# Altium footprint library LukaLIBRARY.PcbLib: 784 footprints (part 38 of 49)
Each footprint in its own frame and in the unit in brackets; x right, y up, seen from the top. Pads: shape width x height; smd on the part's side, far side on the other; paste and mask are expansions set on the pad; w line width, h text height; cw(c..) or ccw(c..) is an arc to the next point about the centre after c.
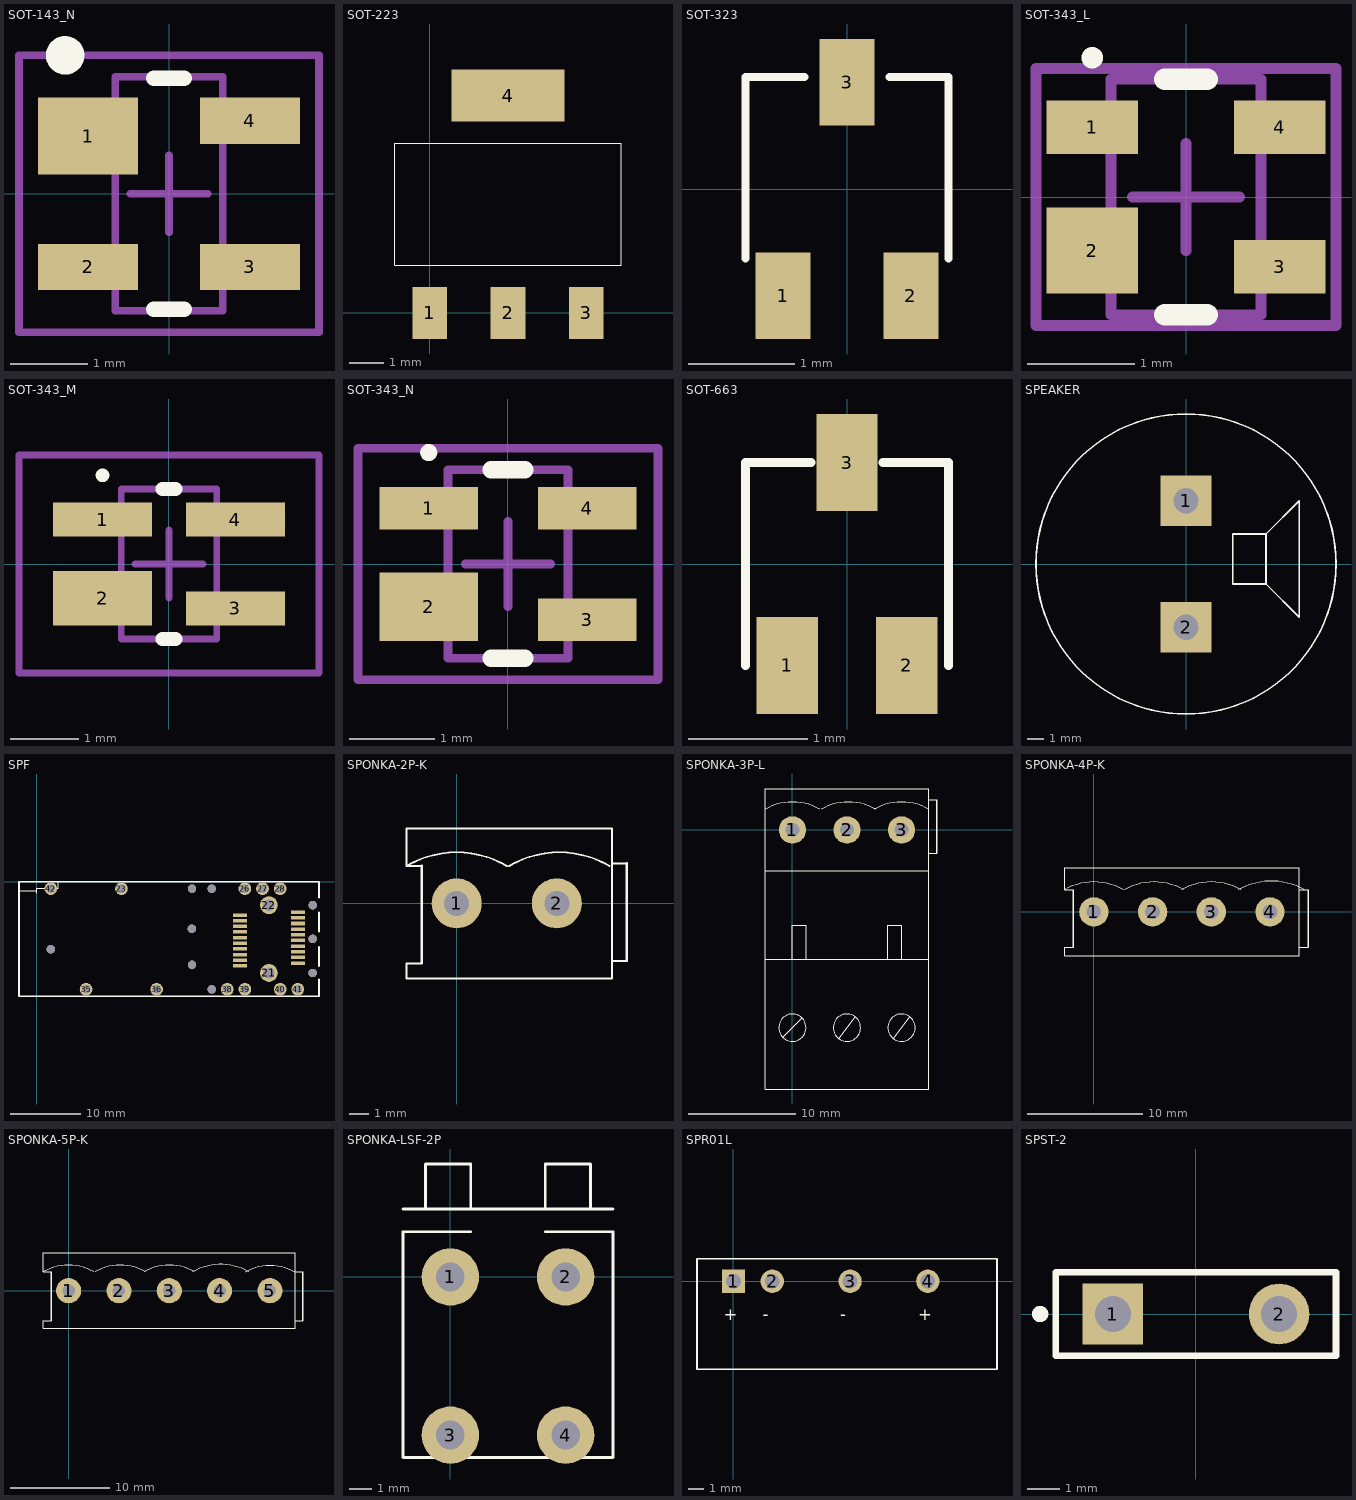
[diagram p37: the footprints below, top view; thin cyan lines are the x and y axes]

## SOT-143_N [mm] "SOT143, 4-Leads, Body 2.9x1.3mm, Pitch 1.9mm, Lead Span 2.5mm, IPC Medium Density"
height 1.1
pads (4):
  rect 1.3x1 smd: 1(-1.05,0.75)
  rect 1.3x0.6 smd: 2(-1.05,-0.95) 3(1.05,-0.95) 4(1.05,0.95)
Top Overlay:
  circle w0.25: c-1.35,1.8 r0.125
  lines w0.2: -0.2,-1.5 0.2,-1.5 ; -0.2,1.5 0.2,1.5
Mechanical 13:
  lines w0.1: -0.7,-1.52 -0.7,1.52 0.7,1.52 0.7,-1.52 -0.7,-1.52
Mechanical 15:
  lines w0.1: -0.5,0 0.5,0 ; 0,-0.5 0,0.5 ; -1.95,-1.8 -1.95,1.8 1.95,1.8 1.95,-1.8 -1.95,-1.8
3D body: height 1.1, standoff 0, extent -0.7,-1.52 0.7,1.52

## SOT-223 [mil]
pads (4):
  rect 40x60 smd mask-1000: 1(0,0) 2(90,0) 3(180,0)
  rect 130x60 smd mask-1000: 4(90,250)
Top Overlay:
  lines w1: -40,55 220,55 220,195 -40,195 -40,55
Top Solder:
  region: 25,220 155,220 155,280 25,280
  region: 160,-30 200,-30 200,30 160,30
  region: 70,-30 110,-30 110,30 70,30
  region: -20,-30 20,-30 20,30 -20,30

## SOT-323 [mm]
pads (3):
  rect 0.513x0.813 smd: 1(-0.6,-1) 2(0.6,-1) 3(0,1)
Top Overlay:
  lines w0.076: -0.95,-0.65 -0.95,1.05 -0.4,1.05 ; 0.4,1.05 0.95,1.05 0.95,-0.65

## SOT-343_L [mm] "SOT343, 4-Leads, Body 2x1.3 mm, Pitch 1.3mm, Lead Span 2.1mm, IPC High Density"
height 1
pads (4):
  rect 0.85x0.5 smd: 1(-0.875,0.65) 3(0.875,-0.65) 4(0.875,0.65)
  rect 0.85x0.8 smd: 2(-0.875,-0.5)
Top Overlay:
  circle w0.1: c-0.875,1.3 r0.05
  lines w0.2: -0.2,-1.1 0.2,-1.1 ; -0.2,1.1 0.2,1.1
Mechanical 13:
  lines w0.1: -0.7,-1.1 -0.7,1.1 0.7,1.1 0.7,-1.1 -0.7,-1.1
Mechanical 15:
  lines w0.1: -0.5,0 0.5,0 ; 0,-0.5 0,0.5 ; -1.4,-1.2 -1.4,1.2 1.4,1.2 1.4,-1.2 -1.4,-1.2
3D body: height 1, standoff 0, extent -0.7,-1.1 0.7,1.1

## SOT-343_M [mm] "SOT343, 4-Leads, Body 2x1.3 mm, Pitch 1.3mm, Lead Span 2.1mm, IPC Low Density"
height 1
pads (4):
  rect 1.45x0.5 smd: 1(-0.975,0.65) 3(0.975,-0.65) 4(0.975,0.65)
  rect 1.45x0.8 smd: 2(-0.975,-0.5)
Top Overlay:
  circle w0.1: c-0.975,1.3 r0.05
  lines w0.2: -0.1,-1.1 0.1,-1.1 ; -0.1,1.1 0.1,1.1
Mechanical 13:
  lines w0.1: -0.7,-1.1 0.7,-1.1 0.7,1.1 -0.7,1.1 -0.7,-1.1
Mechanical 15:
  lines w0.1: -0.5,0 0.5,0 ; 0,-0.5 0,0.5 ; -2.2,-1.6 2.2,-1.6 2.2,1.6 -2.2,1.6 -2.2,-1.6
3D body: height 1, standoff 0, extent -0.7,-1.1 0.7,1.1

## SOT-343_N [mm] "SOT343, 4-Leads, Body 2x1.3 mm, Pitch 1.3mm, Lead Span 2.1mm, IPC Medium Density"
height 1
pads (4):
  rect 1.15x0.5 smd: 1(-0.925,0.65) 3(0.925,-0.65) 4(0.925,0.65)
  rect 1.15x0.8 smd: 2(-0.925,-0.5)
Top Overlay:
  circle w0.1: c-0.925,1.3 r0.05
  lines w0.2: -0.2,-1.1 0.2,-1.1 ; -0.2,1.1 0.2,1.1
Mechanical 13:
  lines w0.1: -0.7,-1.1 0.7,-1.1 0.7,1.1 -0.7,1.1 -0.7,-1.1
Mechanical 15:
  lines w0.1: -0.5,0 0.5,0 ; 0,-0.5 0,0.5 ; -1.75,-1.35 1.75,-1.35 1.75,1.35 -1.75,1.35 -1.75,-1.35
3D body: height 1, standoff 0, extent -0.7,-1.1 0.7,1.1

## SOT-663 [mm]
pads (3):
  rect 0.513x0.813 smd: 1(-0.5,-0.85) 2(0.5,-0.85) 3(0,0.85)
Top Overlay:
  lines w0.076: -0.85,-0.85 -0.85,0.85 -0.3,0.85 ; 0.3,0.85 0.85,0.85 0.85,-0.85

## SPEAKER [mil]
pads (2):
  rect 120x120 hole 60 mask-1000: 1(0,149.61) 2(0,-149.61)
Top Overlay:
  circle w3.94: c0,0 r354.33
  lines w3.94: 188.98,-47.24 110.24,-47.24 110.24,70.87 188.98,70.87 ; 188.98,-47.24 188.98,70.87 ; 188.98,-47.24 267.72,-125.98 267.72,149.61 188.98,70.87
Top Solder:
  region: -60,-209.61 60,-209.61 60,-89.61 -60,-89.61
  region: -60,89.61 60,89.61 60,209.61 -60,209.61
Bottom Solder:
  region: -60,-209.61 60,-209.61 60,-89.61 -60,-89.61
  region: -60,89.61 60,89.61 60,209.61 -60,209.61

## SPF [mm]
pads (42):
  rect 2x0.5 smd mask-25.4: 1(28.78,-4.72) 2(28.78,-5.52) 3(28.78,-6.32) 4(28.78,-7.12) 5(28.78,-7.92) 6(28.78,-8.72) 7(28.78,-9.52) 8(28.78,-10.32) 9(28.78,-11.12) 10(28.78,-11.92) 11(36.98,-11.52) 12(36.98,-10.72) 13(36.98,-9.92) 14(36.98,-9.12) 15(36.98,-8.32) 16(36.98,-7.52) 17(36.98,-6.72) 18(36.98,-5.92) 19(36.98,-5.12) 20(36.98,-4.32)
  round 2.524 hole 1.6: 21(32.88,-12.92) 22(32.88,-3.32)
  round 1.8 hole 1.2 mask-25.4: 23(11.99,-0.99) 26(29.48,-0.99) 27(31.98,-0.99) 28(34.48,-0.99) 35(6.98,-15.24) 36(16.98,-15.24) 38(26.98,-15.24) 39(29.48,-15.24) 40(34.48,-15.24) 41(36.98,-15.24) 42(1.99,-0.98)
  round 1.2 hole 1.2 mask-25.4: 24(21.99,-0.99) 25(24.78,-0.99) 29(39.09,-3.32) 30(39.08,-8.1) 31(39.08,-12.93) 32(21.98,-6.66) 33(1.99,-9.56) 34(21.99,-11.79) 37(24.78,-15.25)
Top Layer:
  lines w0.01: 39.08,-12.93 39.08,-12.9
Top Overlay:
  lines w0.01: -2.49,-1.29 0.01,-1.29 ; 0.01,-1.61 0.01,-0.89 3.01,-0.89 3.01,-0.01
  lines w0.254: 39.97,-11.98 39.97,-9.22 39.97,-9.2 ; 39.97,-2.24 39.97,0.01 -2.52,0.01 -2.52,-16.24 39.98,-16.24 39.98,-13.85 ; 39.98,-7.04 39.98,-4.35
Top Solder:
  drawing of 40 lines, arcs and shapes, not listed
Bottom Solder:
  drawing of 20 lines, arcs and shapes, not listed

## SPONKA-2P-K [mm]
pads (2):
  round 2.54 hole 1.27 mask-25.4: 1(0,0) 2(5.08,0)
Top Overlay:
  lines w0.1: -2.543,1.903 cw(c0,-2.413) 2.543,1.903 ; -1.778,-3.048 -2.54,-3.048 -2.54,-3.81 7.874,-3.81 7.874,3.81 -2.54,3.81 -2.54,1.905 -1.778,1.905 ; 2.664,1.903 cw(c5.207,-2.413) 7.75,1.903 ; 7.874,-2.921 8.636,-2.921 ; 7.874,2.032 8.636,2.032
  lines w0.127: -1.778,-3.048 -1.778,1.905 ; 8.636,-2.921 8.636,2.032
Top Solder:
  region: 5.08,1.281 4.748,1.237 4.44,1.109 4.174,0.906 3.971,0.64 3.843,0.332 3.799,0 3.843,-0.332 3.971,-0.64 4.174,-0.906 4.44,-1.109 4.748,-1.237 5.08,-1.281 5.412,-1.237 5.72,-1.109 5.986,-0.906 6.189,-0.64 6.317,-0.332 6.361,0 6.317,0.332 6.189,0.64 5.986,0.906 5.72,1.109 5.412,1.237
  region: 0,1.281 -0.332,1.237 -0.64,1.109 -0.906,0.906 -1.109,0.64 -1.237,0.332 -1.281,0 -1.237,-0.332 -1.109,-0.64 -0.906,-0.906 -0.64,-1.109 -0.332,-1.237 0,-1.281 0.332,-1.237 0.64,-1.109 0.906,-0.906 1.109,-0.64 1.237,-0.332 1.281,0 1.237,0.332 1.109,0.64 0.906,0.906 0.64,1.109 0.332,1.237
Bottom Solder:
  region: 5.08,1.281 4.748,1.237 4.44,1.109 4.174,0.906 3.971,0.64 3.843,0.332 3.799,0 3.843,-0.332 3.971,-0.64 4.174,-0.906 4.44,-1.109 4.748,-1.237 5.08,-1.281 5.412,-1.237 5.72,-1.109 5.986,-0.906 6.189,-0.64 6.317,-0.332 6.361,0 6.317,0.332 6.189,0.64 5.986,0.906 5.72,1.109 5.412,1.237
  region: 0,1.281 -0.332,1.237 -0.64,1.109 -0.906,0.906 -1.109,0.64 -1.237,0.332 -1.281,0 -1.237,-0.332 -1.109,-0.64 -0.906,-0.906 -0.64,-1.109 -0.332,-1.237 0,-1.281 0.332,-1.237 0.64,-1.109 0.906,-0.906 1.109,-0.64 1.237,-0.332 1.281,0 1.237,0.332 1.109,0.64 0.906,0.906 0.64,1.109 0.332,1.237

## SPONKA-3P-L [mm]
pads (3):
  round 2.54 hole 1.27 mask-25.4: 1(0,0) 2(5.08,0) 3(10.16,0)
Top Overlay:
  circle w0.1: c5.08,-18.415 r1.27
  circle w0.1: c10.16,-18.415 r1.27
  circle w0.1: c0,-18.415 r1.27
  lines w0.1: -2.543,1.903 cw(c0,-2.413) 2.543,1.903 ; -2.54,-12.065 12.7,-12.065 ; -2.54,-3.81 12.7,-3.81 ; -0.889,-19.304 0.889,-17.526 ; 0,-12.065 0,-8.89 1.27,-8.89 1.27,-12.065 ; 2.664,1.903 cw(c5.207,-2.413) 7.75,1.903 ; 4.318,-19.431 5.842,-17.399 ; 7.617,1.903 cw(c10.16,-2.413) 12.703,1.903 ; 8.89,-12.065 8.89,-8.89 10.16,-8.89 10.16,-12.065 ; 9.398,-19.431 10.922,-17.399 ; 12.7,-2.159 13.462,-2.159 ; 12.7,2.794 13.462,2.794 ; -2.54,-24.13 12.7,-24.13 12.7,3.81 -2.54,3.81 -2.54,-24.13
  lines w0.127: 13.462,-2.159 13.462,2.794
Top Solder:
  region: 5.08,1.281 4.748,1.237 4.44,1.109 4.174,0.906 3.971,0.64 3.843,0.332 3.799,0 3.843,-0.332 3.971,-0.64 4.174,-0.906 4.44,-1.109 4.748,-1.237 5.08,-1.281 5.412,-1.237 5.72,-1.109 5.986,-0.906 6.189,-0.64 6.317,-0.332 6.361,0 6.317,0.332 6.189,0.64 5.986,0.906 5.72,1.109 5.412,1.237
  region: 10.16,1.281 9.828,1.237 9.52,1.109 9.254,0.906 9.051,0.64 8.923,0.332 8.879,0 8.923,-0.332 9.051,-0.64 9.254,-0.906 9.52,-1.109 9.828,-1.237 10.16,-1.281 10.492,-1.237 10.8,-1.109 11.066,-0.906 11.269,-0.64 11.397,-0.332 11.441,0 11.397,0.332 11.269,0.64 11.066,0.906 10.8,1.109 10.492,1.237
  region: 0,1.281 -0.332,1.237 -0.64,1.109 -0.906,0.906 -1.109,0.64 -1.237,0.332 -1.281,0 -1.237,-0.332 -1.109,-0.64 -0.906,-0.906 -0.64,-1.109 -0.332,-1.237 0,-1.281 0.332,-1.237 0.64,-1.109 0.906,-0.906 1.109,-0.64 1.237,-0.332 1.281,0 1.237,0.332 1.109,0.64 0.906,0.906 0.64,1.109 0.332,1.237
Bottom Solder:
  region: 5.08,1.281 4.748,1.237 4.44,1.109 4.174,0.906 3.971,0.64 3.843,0.332 3.799,0 3.843,-0.332 3.971,-0.64 4.174,-0.906 4.44,-1.109 4.748,-1.237 5.08,-1.281 5.412,-1.237 5.72,-1.109 5.986,-0.906 6.189,-0.64 6.317,-0.332 6.361,0 6.317,0.332 6.189,0.64 5.986,0.906 5.72,1.109 5.412,1.237
  region: 10.16,1.281 9.828,1.237 9.52,1.109 9.254,0.906 9.051,0.64 8.923,0.332 8.879,0 8.923,-0.332 9.051,-0.64 9.254,-0.906 9.52,-1.109 9.828,-1.237 10.16,-1.281 10.492,-1.237 10.8,-1.109 11.066,-0.906 11.269,-0.64 11.397,-0.332 11.441,0 11.397,0.332 11.269,0.64 11.066,0.906 10.8,1.109 10.492,1.237
  region: 0,1.281 -0.332,1.237 -0.64,1.109 -0.906,0.906 -1.109,0.64 -1.237,0.332 -1.281,0 -1.237,-0.332 -1.109,-0.64 -0.906,-0.906 -0.64,-1.109 -0.332,-1.237 0,-1.281 0.332,-1.237 0.64,-1.109 0.906,-0.906 1.109,-0.64 1.237,-0.332 1.281,0 1.237,0.332 1.109,0.64 0.906,0.906 0.64,1.109 0.332,1.237

## SPONKA-4P-K [mm]
pads (4):
  round 2.54 hole 1.27 mask-25.4: 1(0,0) 2(5.08,0) 3(10.16,0) 4(15.24,0)
Top Overlay:
  lines w0.1: -2.543,1.903 cw(c0,-2.413) 2.543,1.903 ; -1.778,-3.048 -2.54,-3.048 -2.54,-3.81 17.78,-3.81 17.78,3.81 -2.54,3.81 -2.54,1.905 -1.778,1.905 ; 2.664,1.903 cw(c5.207,-2.413) 7.75,1.903 ; 7.617,1.903 cw(c10.16,-2.413) 12.703,1.903 ; 12.531,1.894 cw(c15.367,-2.921) 18.203,1.894 ; 17.78,-3.048 18.542,-3.048 ; 17.78,1.905 18.542,1.905
  lines w0.127: -1.778,-3.048 -1.778,1.905 ; 18.542,-3.048 18.542,1.905
Top Solder:
  region: 0,1.281 -0.332,1.237 -0.64,1.109 -0.906,0.906 -1.109,0.64 -1.237,0.332 -1.281,0 -1.237,-0.332 -1.109,-0.64 -0.906,-0.906 -0.64,-1.109 -0.332,-1.237 0,-1.281 0.332,-1.237 0.64,-1.109 0.906,-0.906 1.109,-0.64 1.237,-0.332 1.281,0 1.237,0.332 1.109,0.64 0.906,0.906 0.64,1.109 0.332,1.237
  region: 5.08,1.281 4.748,1.237 4.44,1.109 4.174,0.906 3.971,0.64 3.843,0.332 3.799,0 3.843,-0.332 3.971,-0.64 4.174,-0.906 4.44,-1.109 4.748,-1.237 5.08,-1.281 5.412,-1.237 5.72,-1.109 5.986,-0.906 6.189,-0.64 6.317,-0.332 6.361,0 6.317,0.332 6.189,0.64 5.986,0.906 5.72,1.109 5.412,1.237
  region: 15.24,1.281 14.908,1.237 14.6,1.109 14.334,0.906 14.131,0.64 14.003,0.332 13.959,0 14.003,-0.332 14.131,-0.64 14.334,-0.906 14.6,-1.109 14.908,-1.237 15.24,-1.281 15.572,-1.237 15.88,-1.109 16.146,-0.906 16.349,-0.64 16.477,-0.332 16.521,0 16.477,0.332 16.349,0.64 16.146,0.906 15.88,1.109 15.572,1.237
  region: 10.16,1.281 9.828,1.237 9.52,1.109 9.254,0.906 9.051,0.64 8.923,0.332 8.879,0 8.923,-0.332 9.051,-0.64 9.254,-0.906 9.52,-1.109 9.828,-1.237 10.16,-1.281 10.492,-1.237 10.8,-1.109 11.066,-0.906 11.269,-0.64 11.397,-0.332 11.441,0 11.397,0.332 11.269,0.64 11.066,0.906 10.8,1.109 10.492,1.237
Bottom Solder:
  region: 0,1.281 -0.332,1.237 -0.64,1.109 -0.906,0.906 -1.109,0.64 -1.237,0.332 -1.281,0 -1.237,-0.332 -1.109,-0.64 -0.906,-0.906 -0.64,-1.109 -0.332,-1.237 0,-1.281 0.332,-1.237 0.64,-1.109 0.906,-0.906 1.109,-0.64 1.237,-0.332 1.281,0 1.237,0.332 1.109,0.64 0.906,0.906 0.64,1.109 0.332,1.237
  region: 5.08,1.281 4.748,1.237 4.44,1.109 4.174,0.906 3.971,0.64 3.843,0.332 3.799,0 3.843,-0.332 3.971,-0.64 4.174,-0.906 4.44,-1.109 4.748,-1.237 5.08,-1.281 5.412,-1.237 5.72,-1.109 5.986,-0.906 6.189,-0.64 6.317,-0.332 6.361,0 6.317,0.332 6.189,0.64 5.986,0.906 5.72,1.109 5.412,1.237
  region: 15.24,1.281 14.908,1.237 14.6,1.109 14.334,0.906 14.131,0.64 14.003,0.332 13.959,0 14.003,-0.332 14.131,-0.64 14.334,-0.906 14.6,-1.109 14.908,-1.237 15.24,-1.281 15.572,-1.237 15.88,-1.109 16.146,-0.906 16.349,-0.64 16.477,-0.332 16.521,0 16.477,0.332 16.349,0.64 16.146,0.906 15.88,1.109 15.572,1.237
  region: 10.16,1.281 9.828,1.237 9.52,1.109 9.254,0.906 9.051,0.64 8.923,0.332 8.879,0 8.923,-0.332 9.051,-0.64 9.254,-0.906 9.52,-1.109 9.828,-1.237 10.16,-1.281 10.492,-1.237 10.8,-1.109 11.066,-0.906 11.269,-0.64 11.397,-0.332 11.441,0 11.397,0.332 11.269,0.64 11.066,0.906 10.8,1.109 10.492,1.237

## SPONKA-5P-K [mm]
pads (5):
  round 2.54 hole 1.27 mask-25.4: 1(0,0) 2(5.08,0) 3(10.16,0) 4(15.24,0) 5(20.32,0)
Top Overlay:
  lines w0.1: -2.543,1.903 cw(c0,-2.413) 2.543,1.903 ; -1.778,-3.048 -2.54,-3.048 -2.54,-3.81 22.86,-3.81 22.86,3.81 -2.54,3.81 -2.54,1.905 -1.778,1.905 ; 2.664,1.903 cw(c5.207,-2.413) 7.75,1.903 ; 7.617,1.903 cw(c10.16,-2.413) 12.703,1.903 ; 12.531,1.894 cw(c15.367,-2.921) 18.203,1.894 ; 17.806,1.855 cw(c20.32,-2.413) 22.834,1.855 ; 22.86,-3.048 23.622,-3.048 ; 22.86,1.905 23.622,1.905
  lines w0.127: -1.778,-3.048 -1.778,1.905 ; 23.622,-3.048 23.622,1.905
Top Solder:
  region: 0,1.281 -0.332,1.237 -0.64,1.109 -0.906,0.906 -1.109,0.64 -1.237,0.332 -1.281,0 -1.237,-0.332 -1.109,-0.64 -0.906,-0.906 -0.64,-1.109 -0.332,-1.237 0,-1.281 0.332,-1.237 0.64,-1.109 0.906,-0.906 1.109,-0.64 1.237,-0.332 1.281,0 1.237,0.332 1.109,0.64 0.906,0.906 0.64,1.109 0.332,1.237
  region: 10.16,1.281 9.828,1.237 9.52,1.109 9.254,0.906 9.051,0.64 8.923,0.332 8.879,0 8.923,-0.332 9.051,-0.64 9.254,-0.906 9.52,-1.109 9.828,-1.237 10.16,-1.281 10.492,-1.237 10.8,-1.109 11.066,-0.906 11.269,-0.64 11.397,-0.332 11.441,0 11.397,0.332 11.269,0.64 11.066,0.906 10.8,1.109 10.492,1.237
  region: 15.24,1.281 14.908,1.237 14.6,1.109 14.334,0.906 14.131,0.64 14.003,0.332 13.959,0 14.003,-0.332 14.131,-0.64 14.334,-0.906 14.6,-1.109 14.908,-1.237 15.24,-1.281 15.572,-1.237 15.88,-1.109 16.146,-0.906 16.349,-0.64 16.477,-0.332 16.521,0 16.477,0.332 16.349,0.64 16.146,0.906 15.88,1.109 15.572,1.237
  region: 5.08,1.281 4.748,1.237 4.44,1.109 4.174,0.906 3.971,0.64 3.843,0.332 3.799,0 3.843,-0.332 3.971,-0.64 4.174,-0.906 4.44,-1.109 4.748,-1.237 5.08,-1.281 5.412,-1.237 5.72,-1.109 5.986,-0.906 6.189,-0.64 6.317,-0.332 6.361,0 6.317,0.332 6.189,0.64 5.986,0.906 5.72,1.109 5.412,1.237
  region: 20.32,1.281 19.988,1.237 19.68,1.109 19.414,0.906 19.211,0.64 19.083,0.332 19.039,0 19.083,-0.332 19.211,-0.64 19.414,-0.906 19.68,-1.109 19.988,-1.237 20.32,-1.281 20.652,-1.237 20.96,-1.109 21.226,-0.906 21.429,-0.64 21.557,-0.332 21.601,0 21.557,0.332 21.429,0.64 21.226,0.906 20.96,1.109 20.652,1.237
Bottom Solder:
  region: 0,1.281 -0.332,1.237 -0.64,1.109 -0.906,0.906 -1.109,0.64 -1.237,0.332 -1.281,0 -1.237,-0.332 -1.109,-0.64 -0.906,-0.906 -0.64,-1.109 -0.332,-1.237 0,-1.281 0.332,-1.237 0.64,-1.109 0.906,-0.906 1.109,-0.64 1.237,-0.332 1.281,0 1.237,0.332 1.109,0.64 0.906,0.906 0.64,1.109 0.332,1.237
  region: 10.16,1.281 9.828,1.237 9.52,1.109 9.254,0.906 9.051,0.64 8.923,0.332 8.879,0 8.923,-0.332 9.051,-0.64 9.254,-0.906 9.52,-1.109 9.828,-1.237 10.16,-1.281 10.492,-1.237 10.8,-1.109 11.066,-0.906 11.269,-0.64 11.397,-0.332 11.441,0 11.397,0.332 11.269,0.64 11.066,0.906 10.8,1.109 10.492,1.237
  region: 15.24,1.281 14.908,1.237 14.6,1.109 14.334,0.906 14.131,0.64 14.003,0.332 13.959,0 14.003,-0.332 14.131,-0.64 14.334,-0.906 14.6,-1.109 14.908,-1.237 15.24,-1.281 15.572,-1.237 15.88,-1.109 16.146,-0.906 16.349,-0.64 16.477,-0.332 16.521,0 16.477,0.332 16.349,0.64 16.146,0.906 15.88,1.109 15.572,1.237
  region: 5.08,1.281 4.748,1.237 4.44,1.109 4.174,0.906 3.971,0.64 3.843,0.332 3.799,0 3.843,-0.332 3.971,-0.64 4.174,-0.906 4.44,-1.109 4.748,-1.237 5.08,-1.281 5.412,-1.237 5.72,-1.109 5.986,-0.906 6.189,-0.64 6.317,-0.332 6.361,0 6.317,0.332 6.189,0.64 5.986,0.906 5.72,1.109 5.412,1.237
  region: 20.32,1.281 19.988,1.237 19.68,1.109 19.414,0.906 19.211,0.64 19.083,0.332 19.039,0 19.083,-0.332 19.211,-0.64 19.414,-0.906 19.68,-1.109 19.988,-1.237 20.32,-1.281 20.652,-1.237 20.96,-1.109 21.226,-0.906 21.429,-0.64 21.557,-0.332 21.601,0 21.557,0.332 21.429,0.64 21.226,0.906 20.96,1.109 20.652,1.237

## SPONKA-LSF-2P [mm]
pads (4):
  round 2.54 hole 1.27 mask-25.4: 1(0,0) 2(5.1,0) 3(0,-7) 4(5.1,-7)
Top Overlay:
  lines w0.127: -2.1,3 7.2,3 ; -1.1,3 -1.1,5 0.9,5 0.9,3 ; 0.9,2 -2.1,2 -2.1,0 -2.1,-8 7.2,-8 7.2,2 4.2,2 ; 4.2,3 4.2,5 6.2,5 6.2,3
Top Solder:
  region: 5.1,-5.719 4.768,-5.763 4.46,-5.891 4.194,-6.094 3.991,-6.36 3.863,-6.668 3.819,-7 3.863,-7.332 3.991,-7.64 4.194,-7.906 4.46,-8.109 4.768,-8.237 5.1,-8.281 5.432,-8.237 5.74,-8.109 6.006,-7.906 6.209,-7.64 6.337,-7.332 6.381,-7 6.337,-6.668 6.209,-6.36 6.006,-6.094 5.74,-5.891 5.432,-5.763
  region: 5.1,1.281 4.768,1.237 4.46,1.109 4.194,0.906 3.991,0.64 3.863,0.332 3.819,0 3.863,-0.332 3.991,-0.64 4.194,-0.906 4.46,-1.109 4.768,-1.237 5.1,-1.281 5.432,-1.237 5.74,-1.109 6.006,-0.906 6.209,-0.64 6.337,-0.332 6.381,0 6.337,0.332 6.209,0.64 6.006,0.906 5.74,1.109 5.432,1.237
  region: 0,-5.719 -0.332,-5.763 -0.64,-5.891 -0.906,-6.094 -1.109,-6.36 -1.237,-6.668 -1.281,-7 -1.237,-7.332 -1.109,-7.64 -0.906,-7.906 -0.64,-8.109 -0.332,-8.237 0,-8.281 0.332,-8.237 0.64,-8.109 0.906,-7.906 1.109,-7.64 1.237,-7.332 1.281,-7 1.237,-6.668 1.109,-6.36 0.906,-6.094 0.64,-5.891 0.332,-5.763
  region: 0,1.281 -0.332,1.237 -0.64,1.109 -0.906,0.906 -1.109,0.64 -1.237,0.332 -1.281,0 -1.237,-0.332 -1.109,-0.64 -0.906,-0.906 -0.64,-1.109 -0.332,-1.237 0,-1.281 0.332,-1.237 0.64,-1.109 0.906,-0.906 1.109,-0.64 1.237,-0.332 1.281,0 1.237,0.332 1.109,0.64 0.906,0.906 0.64,1.109 0.332,1.237
Bottom Solder:
  region: 5.1,-5.719 4.768,-5.763 4.46,-5.891 4.194,-6.094 3.991,-6.36 3.863,-6.668 3.819,-7 3.863,-7.332 3.991,-7.64 4.194,-7.906 4.46,-8.109 4.768,-8.237 5.1,-8.281 5.432,-8.237 5.74,-8.109 6.006,-7.906 6.209,-7.64 6.337,-7.332 6.381,-7 6.337,-6.668 6.209,-6.36 6.006,-6.094 5.74,-5.891 5.432,-5.763
  region: 5.1,1.281 4.768,1.237 4.46,1.109 4.194,0.906 3.991,0.64 3.863,0.332 3.819,0 3.863,-0.332 3.991,-0.64 4.194,-0.906 4.46,-1.109 4.768,-1.237 5.1,-1.281 5.432,-1.237 5.74,-1.109 6.006,-0.906 6.209,-0.64 6.337,-0.332 6.381,0 6.337,0.332 6.209,0.64 6.006,0.906 5.74,1.109 5.432,1.237
  region: 0,-5.719 -0.332,-5.763 -0.64,-5.891 -0.906,-6.094 -1.109,-6.36 -1.237,-6.668 -1.281,-7 -1.237,-7.332 -1.109,-7.64 -0.906,-7.906 -0.64,-8.109 -0.332,-8.237 0,-8.281 0.332,-8.237 0.64,-8.109 0.906,-7.906 1.109,-7.64 1.237,-7.332 1.281,-7 1.237,-6.668 1.109,-6.36 0.906,-6.094 0.64,-5.891 0.332,-5.763
  region: 0,1.281 -0.332,1.237 -0.64,1.109 -0.906,0.906 -1.109,0.64 -1.237,0.332 -1.281,0 -1.237,-0.332 -1.109,-0.64 -0.906,-0.906 -0.64,-1.109 -0.332,-1.237 0,-1.281 0.332,-1.237 0.64,-1.109 0.906,-0.906 1.109,-0.64 1.237,-0.332 1.281,0 1.237,0.332 1.109,0.64 0.906,0.906 0.64,1.109 0.332,1.237

## SPR01L [mil]
pads (4):
  rect 60x60 hole 38 mask-1000: 1(0,0)
  round 60 hole 38 mask-1000: 2(100,0) 3(300,0) 4(500,0)
Top Overlay:
  lines w3.94: -93.7,-225.98 -93.7,57.48 677.95,57.48 677.95,-225.98 -93.7,-225.98
  text "-" at 75,-100 h31.25
  text "+" at 475,-100 h31.25
  text "+" at -25,-100 h31.25
  text "-" at 275,-100 h31.25
Top Solder:
  region: 100,30.26 92.17,29.23 84.87,26.2 78.6,21.4 73.8,15.13 70.77,7.83 69.74,0 70.77,-7.83 73.8,-15.13 78.6,-21.4 84.87,-26.2 92.17,-29.23 100,-30.26 107.83,-29.23 115.13,-26.2 121.4,-21.4 126.2,-15.13 129.23,-7.83 130.26,0 129.23,7.83 126.2,15.13 121.4,21.4 115.13,26.2 107.83,29.23
  region: 500,30.26 492.17,29.23 484.87,26.2 478.6,21.4 473.8,15.13 470.77,7.83 469.74,0 470.77,-7.83 473.8,-15.13 478.6,-21.4 484.87,-26.2 492.17,-29.23 500,-30.26 507.83,-29.23 515.13,-26.2 521.4,-21.4 526.21,-15.13 529.23,-7.83 530.26,0 529.23,7.83 526.21,15.13 521.4,21.4 515.13,26.2 507.83,29.23
  region: -30,-30 30,-30 30,30 -30,30
  region: 300,30.26 292.17,29.23 284.87,26.2 278.6,21.4 273.8,15.13 270.77,7.83 269.74,0 270.77,-7.83 273.8,-15.13 278.6,-21.4 284.87,-26.2 292.17,-29.23 300,-30.26 307.83,-29.23 315.13,-26.2 321.4,-21.4 326.2,-15.13 329.23,-7.83 330.26,0 329.23,7.83 326.2,15.13 321.4,21.4 315.13,26.2 307.83,29.23
Bottom Solder:
  region: 100,30.26 92.17,29.23 84.87,26.2 78.6,21.4 73.8,15.13 70.77,7.83 69.74,0 70.77,-7.83 73.8,-15.13 78.6,-21.4 84.87,-26.2 92.17,-29.23 100,-30.26 107.83,-29.23 115.13,-26.2 121.4,-21.4 126.2,-15.13 129.23,-7.83 130.26,0 129.23,7.83 126.2,15.13 121.4,21.4 115.13,26.2 107.83,29.23
  region: 500,30.26 492.17,29.23 484.87,26.2 478.6,21.4 473.8,15.13 470.77,7.83 469.74,0 470.77,-7.83 473.8,-15.13 478.6,-21.4 484.87,-26.2 492.17,-29.23 500,-30.26 507.83,-29.23 515.13,-26.2 521.4,-21.4 526.21,-15.13 529.23,-7.83 530.26,0 529.23,7.83 526.21,15.13 521.4,21.4 515.13,26.2 507.83,29.23
  region: -30,-30 30,-30 30,30 -30,30
  region: 300,30.26 292.17,29.23 284.87,26.2 278.6,21.4 273.8,15.13 270.77,7.83 269.74,0 270.77,-7.83 273.8,-15.13 278.6,-21.4 284.87,-26.2 292.17,-29.23 300,-30.26 307.83,-29.23 315.13,-26.2 321.4,-21.4 326.2,-15.13 329.23,-7.83 330.26,0 329.23,7.83 326.2,15.13 321.4,21.4 315.13,26.2 307.83,29.23

## SPST-2 [mm] "Switch; 2 Leads"
pads (2):
  rect 1.85x1.85 hole 1.1: 1(-2.54,0)
  round 1.85 hole 1.1: 2(2.54,0)
Top Overlay:
  circle w0.25: c-4.761,-0.001 r0.125
  lines w0.2: -4.28,-1.27 4.28,-1.27 4.28,1.27 -4.28,1.27 -4.28,-1.27